# Altium footprint library PcbLib1.PcbLib: 49 footprints (part 1 of 4)
Each footprint in its own frame and in the unit in brackets; x right, y up, seen from the top. Pads: shape width x height; smd on the part's side, far side on the other; paste and mask are expansions set on the pad; w line width, h text height; cw(c..) or ccw(c..) is an arc to the next point about the centre after c.
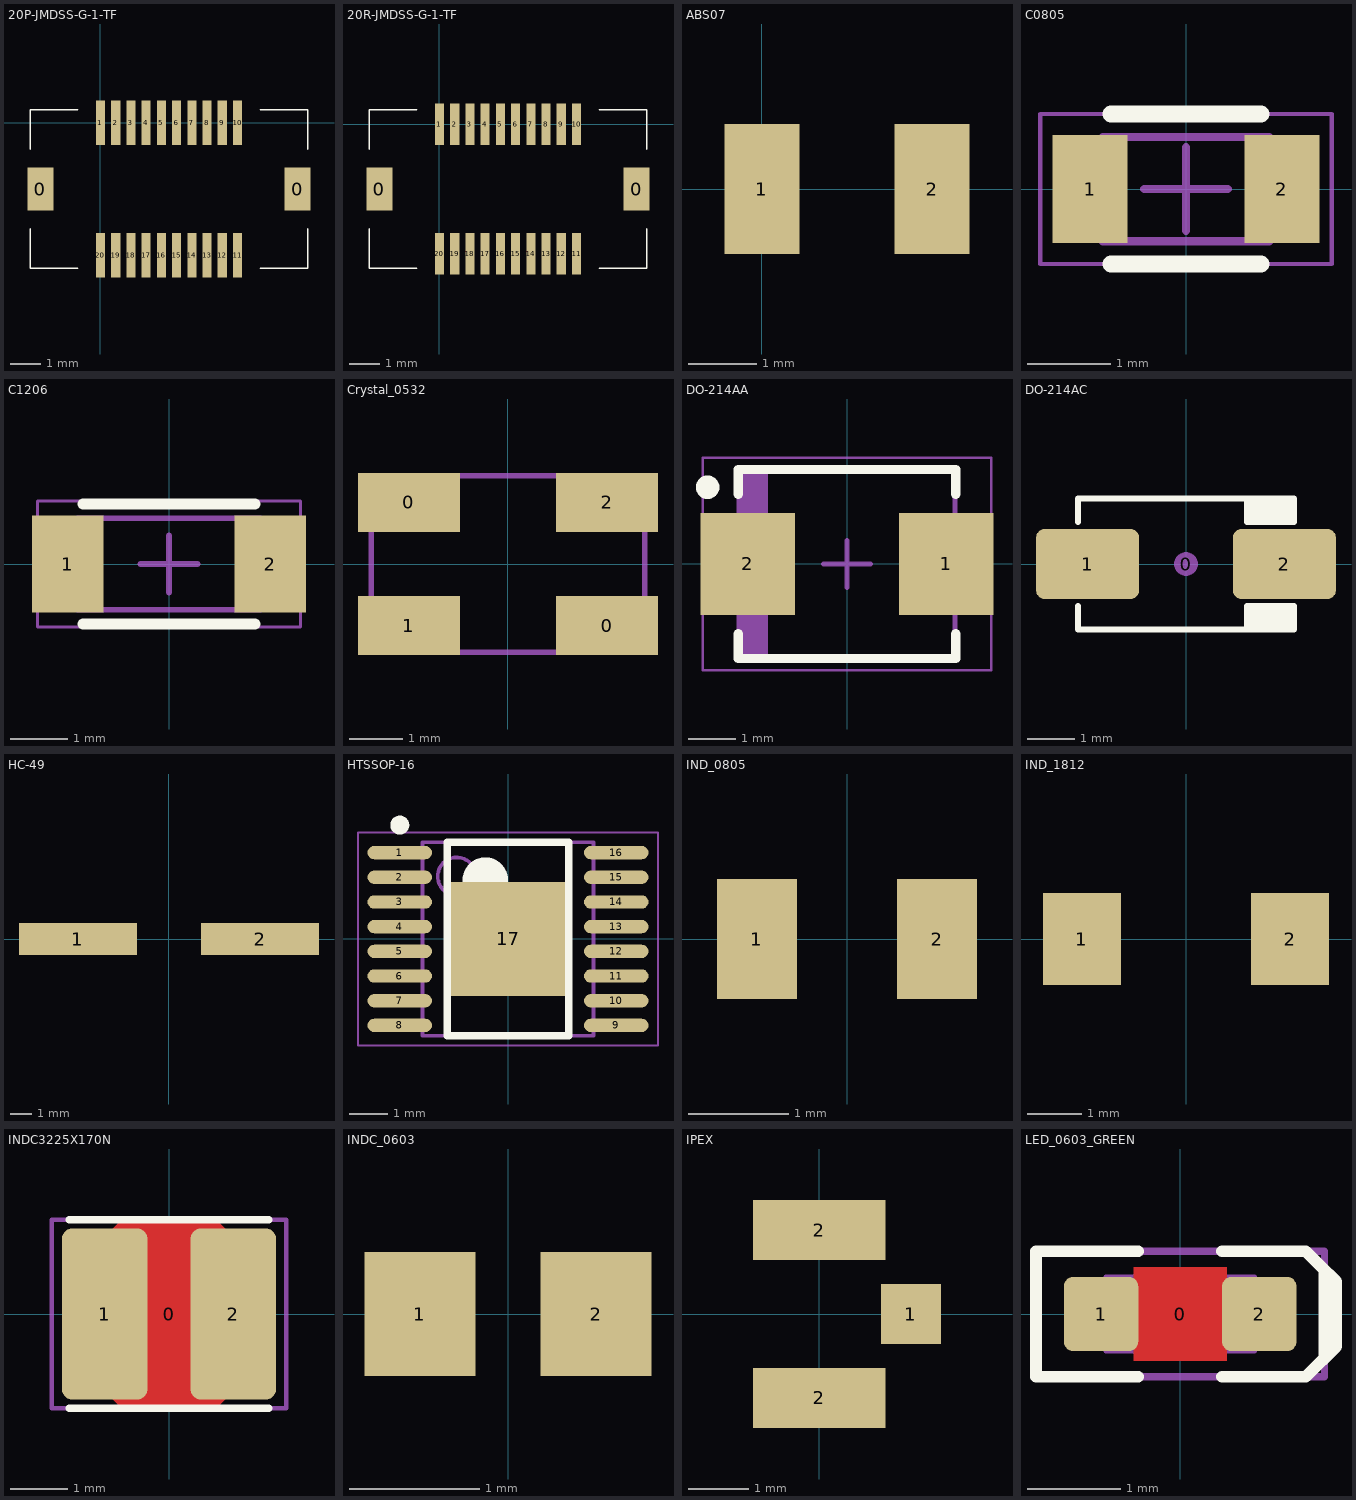
[diagram p0: the footprints below, top view; thin cyan lines are the x and y axes]

## 20P-JMDSS-G-1-TF [mm] "20 pin plug"
pads (22):
  rect 0.85x1.4 smd: 0(-1.975,-2.175) 0(6.475,-2.175)
  rect 0.3x1.45 smd: 1(0,0) 2(0.5,0) 3(1,0) 4(1.5,0) 5(2,0) 6(2.5,0) 7(3,0) 8(3.5,0) 9(4,0) 10(4.5,0) 11(4.5,-4.35) 12(4,-4.35) 13(3.5,-4.35) 14(3,-4.35) 15(2.5,-4.35) 16(2,-4.35) 17(1.5,-4.35) 18(1,-4.35) 19(0.5,-4.35) 20(0,-4.35)
Top Overlay:
  lines w0.05: -2.3,-3.475 -2.3,-4.775 -0.75,-4.775 ; -2.3,-0.875 -2.3,0.425 -0.75,0.425 ; 5.25,-4.775 6.8,-4.775 6.8,-3.475 ; 5.25,0.425 6.8,0.425 6.8,-0.875

## 20R-JMDSS-G-1-TF [mm] "20 pin Receptacle"
pads (22):
  rect 0.85x1.4 smd: 0(-1.975,-2.125) 0(6.475,-2.125)
  rect 0.3x1.35 smd: 1(0,0) 2(0.5,0) 3(1,0) 4(1.5,0) 5(2,0) 6(2.5,0) 7(3,0) 8(3.5,0) 9(4,0) 10(4.5,0) 11(4.5,-4.25) 12(4,-4.25) 13(3.5,-4.25) 14(3,-4.25) 15(2.5,-4.25) 16(2,-4.25) 17(1.5,-4.25) 18(1,-4.25) 19(0.5,-4.25) 20(0,-4.25)
Top Overlay:
  lines w0.05: -2.3,-3.425 -2.3,-4.725 -0.75,-4.725 ; -2.3,-0.825 -2.3,0.475 -0.75,0.475 ; 5.25,-4.725 6.8,-4.725 6.8,-3.425 ; 5.25,0.475 6.8,0.475 6.8,-0.825

## ABS07 [mm] "32.768"
pads (2):
  rect 1.1x1.9 smd: 1(0,0) 2(2.5,0)
3D body "ABS07.STEP": height 0.91, standoff 0, extent -0.36,-0.76 2.86,0.76

## C0805 [mm] "Chip Capacitor, 2-Leads, Body 2,00x1,25mm, IPC Medium Density"
height 1.45
pads (2):
  rect 0.9x1.3 smd: 1(-1.15,0) 2(1.15,0)
Top Overlay:
  lines w0.2: -0.9,-0.9 0.9,-0.9 ; -0.9,0.9 0.9,0.9
Mechanical 13:
  lines w0.1: -1,-0.625 1,-0.625 1,0.625 -1,0.625 -1,-0.625
Mechanical 15:
  lines w0.05: -1.75,-0.9 1.75,-0.9 1.75,0.9 -1.75,0.9 -1.75,-0.9
  lines w0.1: -0.5,0 0.5,0 ; 0,-0.5 0,0.5
3D body "Chip Capacitor 0805.step": height 1.32, standoff 0, extent -1,-0.635 1,0.635

## C1206 [mm] "Chip Capacitor, 2-Leads, Body 3,20x1,60mm, IPC Medium Density"
height 1.75
pads (2):
  rect 1.25x1.7 smd: 1(-1.775,0) 2(1.775,0)
Top Overlay:
  lines w0.2: -1.5,-1.05 1.5,-1.05 ; -1.5,1.05 1.5,1.05
Mechanical 13:
  lines w0.1: -1.6,-0.8 -1.6,0.8 1.6,0.8 1.6,-0.8 -1.6,-0.8
Mechanical 15:
  lines w0.05: -2.3,-1.1 -2.3,1.1 2.3,1.1 2.3,-1.1 -2.3,-1.1
  lines w0.1: -0.5,0 0.5,0 ; 0,-0.5 0,0.5
3D body "Chip Capacitor 1206.step": height 1.52, standoff 0, extent -1.6,-0.81 1.6,0.81

## Crystal_0532 [mm]
pads (4):
  rect 1.9x1.1 smd: 0(-1.85,1.15) 0(1.85,-1.15) 1(-1.85,-1.15) 2(1.85,1.15)
Mechanical 15:
  lines w0.1: -2.55,-1.65 -2.55,1.65 -0.55,1.65 2.55,1.65 2.55,-1.65 -2.55,-1.65
  text ".Designator" at -1.55,-0.05 h0.5
3D body "CRYSTALSMD5X32.step": height 1, standoff 0, extent -2.5,-1.6 2.5,1.6

## DO-214AA [mm] "Molded Diode, 2-Leads, Body 4,31x3,62mm, IPC Medium Density"
height 2.62
pads (2):
  rect 2x2.15 smd: 1(2.1,0) 2(-2.1,0)
Top Overlay:
  circle w0.25: c-2.95,1.625 r0.125
  lines w0.2: -2.3,-1.475 -2.3,-2 2.3,-2 2.3,-1.475 ; -2.3,1.475 -2.3,2 2.3,2 2.3,1.475
Mechanical 13:
  rectangle: -2.285,-1.97 -1.67,1.97
  lines w0.1: -2.285,-1.97 2.285,-1.97 2.285,1.97 -2.285,1.97 -2.285,-1.97
Mechanical 15:
  lines w0.05: -3.05,-2.25 3.05,-2.25 3.05,2.25 -3.05,2.25 -3.05,-2.25
  lines w0.1: -0.5,0 0.5,0 ; 0,-0.5 0,0.5
3D body "User Library-DIOM5539X24.step": height 2.45, standoff 0.03, extent -2.75,-1.95 2.75,1.95

## DO-214AC [mm] "JEDEC DO214 variation AC. SMA"
height 2.5
pads (3):
  round 0.508 on Mech15: 0(0,0)
  rrect25% 2.2x1.5 smd: 1(-2.1,0) 2(2.1,0)
Top Overlay:
  rectangle: 1.3,-1.4 2.3,-0.9
  rectangle: 1.3,0.9 2.3,1.4
  lines w0.127: -2.3,-0.9 -2.3,-1.4 2.3,-1.4 2.3,-0.9 1.3,-0.9 1.3,-1.4 ; -2.3,0.9 -2.3,1.4 2.3,1.4 2.3,0.9 1.3,0.9 ; 1.3,0.911 1.3,1.4
3D body "SW3dPS-DO-214AC SMA.STEP": height 2.42, standoff 0.02, extent -2.6,-1.3 2.6,1.3

## HC-49 [mm]
pads (2):
  rect 5.5x1.5 smd: 1(-4.25,0) 2(4.25,0)
3D body "HC49_SMD.step": height 4.3, standoff 0, extent -6.15,-2.25 6.15,2.25

## HTSSOP-16 [mm] "HTSOP, 16-Leads, Body 5,00x4,40mm, Pitch 0,65mm, IPC Medium Density"
height 1.2
pads (17):
  oval 1.7x0.35 smd: 1(-2.85,2.275) 2(-2.85,1.625) 3(-2.85,0.975) 4(-2.85,0.325) 5(-2.85,-0.325) 6(-2.85,-0.975) 7(-2.85,-1.625) 8(-2.85,-2.275) 9(2.85,-2.275) 10(2.85,-1.625) 11(2.85,-0.975) 12(2.85,-0.325) 13(2.85,0.325) 14(2.85,0.975) 15(2.85,1.625) 16(2.85,2.275)
  rect 3x3 smd: 17(0,0)
Top Overlay:
  circle w0.6: c-0.6,1.55 r0.3
  circle w0.25: c-2.85,3 r0.125
  lines w0.2: -1.6,-2.55 1.6,-2.55 1.6,2.55 -1.6,2.55 -1.6,-2.55
Mechanical 13:
  circle w0.1: c-1.35,1.65 r0.5
  lines w0.1: -2.25,-2.55 2.25,-2.55 2.25,2.55 -2.25,2.55 -2.25,-2.55
Mechanical 15:
  lines w0.05: -3.95,-2.8 3.95,-2.8 3.95,2.8 -3.95,2.8 -3.95,-2.8
  lines w0.1: -0.5,0 0.5,0 ; 0,-0.5 0,0.5
3D body "User Library-TSSOP-16-1.step": height 1.1, standoff 0, extent -3.2,-2.5 3.2,2.5

## IND_0805 [mm]
pads (2):
  rect 0.8x1.2 smd: 1(-0.9,0) 2(0.9,0)
3D body "L0805.stp": height 1.25, standoff 0, extent -1,-0.625 1,0.625

## IND_1812 [mm]
pads (2):
  rect 1.45x1.7 smd: 1(-1.925,0) 2(1.925,0)
3D body "L1862.step": height 3.2, standoff 0, extent -2.25,-1.6 2.25,1.6

## INDC3225X170N [mm] "Chip Inductor, 2-Leads, Body 3.2x2.5mm, IPC Medium Density"
height 1.7
pads (3):
  round 0.508 on Mech15: 0(0,0)
  rrect25% 1.5x3 smd: 1(-1.125,0) 2(1.125,0)
Top Layer:
  pour cut-out: -1.125,1.35 -0.825,1.65 0.825,1.65 1.125,1.35 1.125,-1.35 0.825,-1.65 -0.825,-1.65 -1.125,-1.35
Top Overlay:
  lines w0.127: -1.75,-1.651 1.75,-1.651 ; -1.75,1.651 1.75,1.651
Mechanical 13:
  lines w0.05: -1.7,-1.35 -1.7,1.35 1.7,1.35 1.7,-1.35 -1.7,-1.35
Mechanical 15:
  lines w0.076: -2.05,-1.65 2.05,-1.65 2.05,1.65 -2.05,1.65 -2.05,-1.65
3D body "INDC3225X170N.STEP": height 1.7, standoff 0, extent -1.71,-1.36 1.71,1.36

## INDC_0603 [mm] "Chip Inductor, 2-Leads, Body 1,60x1,00mm, IPC Medium Density"
height 1
pads (2):
  rect 0.85x0.95 smd: 1(-0.675,0) 2(0.675,0)
3D body "Coilcraft-0603CT.step": height 0.59, standoff -0.03, extent -0.785,-0.42 0.785,0.42

## IPEX [mm]
pads (3):
  rect 1x1 smd: 1(1.524,0)
  rect 2.2x1 smd: 2(0,-1.397) 2(0,1.397)
3D body "User Library-20279-001.step": height 1.25, standoff -0.01, extent -1.55,-1.5 1.55,1.5

## LED_0603_GREEN [mm]
height 0.8
pads (3):
  round 0.254 on Mech15: 0(0,0)
  rrect25% 0.8x0.8 smd: 1(-0.85,0) 2(0.85,0)
Top Layer:
  pour cut-out: -0.5,0.5 0.5,0.5 0.5,-0.5 -0.5,-0.5
Top Overlay:
  lines w0.127: -0.45,-0.675 -1.55,-0.675 -1.55,0.675 -0.45,0.675 ; 0.45,-0.675 1.35,-0.675 1.55,-0.475 1.55,0.475 1.35,0.675 0.45,0.675 ; 1.5,0.525 1.675,0.35 1.675,-0.35 1.525,-0.5
Mechanical 13:
  lines w0.05: -0.6,-0.4 -0.6,0.399 0.6,0.4 0.6,-0.4 -0.6,-0.399 ; -0.505,-0.398 -0.505,0.398 ; -0.5,-0.4 -0.8,-0.4 -0.8,0.4 -0.5,0.4 ; 0.5,-0.4 0.8,-0.4 0.8,0.4 0.5,0.4 ; 0.505,-0.398 0.505,0.398 ; -0.599,-0.398 0.599,-0.398 0.599,0.398 -0.599,0.398 -0.599,-0.398
Mechanical 15:
  lines w0.076: -1.55,-0.675 -1.55,0.675 1.55,0.675 1.55,-0.675 -1.55,-0.675
3D body "User Library-LED_0603_G.STEP": height 0.6, standoff 0, extent -0.8,-0.4 0.8,0.4